# Altium schematic symbol library Semi-ATE.SchLib: 322 symbols (part 4 of 6) (continued)
## R_42 (continued)
RES SMD 1K OHM 0.1% 1W 0805; 04. Manufacturer: Vishay Thin Film; 07. Manufacturer  Part Number: PCAN0805E1001BST5; 03. Unit Price: 1.34; 13. Created Date/Name: AUG2018/Hören; 3D-Export: No; Tolerance: ±0.1%; ComponentLink1URL: https://www.digikey.de/products/en/resistors/chip-resistor-surface-mount/52?k=&pkeyword=&sv=0&pv7=243&sf=1&FV=c0172%2C44006b%2C142c040d%2C1f140000%2Cmu1+kOhms%7C2085%2Cffe00034%2C80006&quantity=&ColumnSort=0&page=1&pageSize=25; ComponentLink1Description: Info; 02. Distributor Part Number: 764-1240-6-ND; 09. Operating Temperature: -55°C ~ 155°C; 11. RoHS: YES; 01. Distributor: DigiKey; ComponentLink2Description: DataSheet; ComponentLink2URL: http://www.vishay.com/docs/60125/pcan.pdf; Type: Thin Film; Power Rating: 1W
simulation model RESISTOR (Resistor)
signal-integrity model Res
footprint TO247-2
footprint R0201 Reflow (SMT Resistor 0201 Reflow Soldering)
footprint R0402 Reflow (SMT Resistor 0402 Reflow Soldering)
footprint R0603 Reflow (SMT Resistor 0603 Reflow Soldering)
footprint R0603 Wave (SMT Resistor 0603 Wave Soldering)
footprint R0805 Wave (SMT Resistor 0805 Wave Soldering)
footprint R0805 Reflow (SMT Resistor 0805 Reflow Soldering)
footprint R01005 Reflow (SMT Resistor 01005 Reflow Soldering)
footprint R1020 Reflow (SMT Resistor 0805 Reflow Soldering)
footprint R1020 Wave (SMT Resistor 0805 Wave Soldering)
footprint R1812 Reflow (SMT Resistor 1812 Reflow Soldering)
footprint R1812 Wave (SMT Resistor 1812 Wave Soldering)
footprint R1206 Reflow (SMT Resistor 1206 Reflow Soldering)
footprint R1206 Wave (SMT Resistor 1206 Wave Soldering)
footprint R1210 Reflow (SMT Resistor 1210 Reflow Soldering)
footprint R1210 Wave (SMT Resistor 1210 Wave Soldering)
footprint R2010 Reflow (SMT Resistor 2010 Reflow Soldering)
footprint R2010 Wave (SMT Resistor 2010 Wave Soldering)
footprint R2512 Reflow (SMT Resistor 2512 Reflow Soldering)
footprint R2512 Wave (SMT Resistor 2512 Wave Soldering)
footprint TO-220-2-Standing
pins: 1, 2
1 alternate drawing of the same symbol

## R_43
designator R?, comment value 10K  Tolerance: ±0.05%  TC: ±5ppm/°C  Package: 0603  (hidden comment: R)
RES 10 KOHM 0.05% 1/10W 0603; 04. Manufacturer: Vishay Dale; 07. Manufacturer  Part Number: TNPU060310K0AZEA00; 03. Unit Price: 2.40; 13. Created Date/Name: AUG2018/Hören; Power Rating: 100mW; 3D-Export: No; ComponentLink1URL: https://www.digikey.de/product-detail/en/vishay-dale/TNPU060310K0AZEA00/541-4643-6-ND/9448930; ComponentLink1Description: Info; 02. Distributor Part Number: 541-4643-6-ND; 09. Operating Temperature: -55°C ~ 125°C; 11. RoHS: YES; 01. Distributor: DigiKey; ComponentLink2Description: DataSheet; ComponentLink2URL: http://www.vishay.com/docs/28779/tnpue3.pdf; Type: Thin Film
simulation model RESISTOR (Resistor)
signal-integrity model Res
footprint TO247-2
footprint R0201 Reflow (SMT Resistor 0201 Reflow Soldering)
footprint R0402 Reflow (SMT Resistor 0402 Reflow Soldering)
footprint R0603 Reflow (SMT Resistor 0603 Reflow Soldering)
footprint R0603 Wave (SMT Resistor 0603 Wave Soldering)
footprint R0805 Wave (SMT Resistor 0805 Wave Soldering)
footprint R0805 Reflow (SMT Resistor 0805 Reflow Soldering)
footprint R01005 Reflow (SMT Resistor 01005 Reflow Soldering)
footprint R1020 Reflow (SMT Resistor 0805 Reflow Soldering)
footprint R1020 Wave (SMT Resistor 0805 Wave Soldering)
footprint R1812 Reflow (SMT Resistor 1812 Reflow Soldering)
footprint R1812 Wave (SMT Resistor 1812 Wave Soldering)
footprint R1206 Reflow (SMT Resistor 1206 Reflow Soldering)
footprint R1206 Wave (SMT Resistor 1206 Wave Soldering)
footprint R1210 Reflow (SMT Resistor 1210 Reflow Soldering)
footprint R1210 Wave (SMT Resistor 1210 Wave Soldering)
footprint R2010 Reflow (SMT Resistor 2010 Reflow Soldering)
footprint R2010 Wave (SMT Resistor 2010 Wave Soldering)
footprint R2512 Reflow (SMT Resistor 2512 Reflow Soldering)
footprint R2512 Wave (SMT Resistor 2512 Wave Soldering)
footprint TO-220-2-Standing
pins: 1, 2
1 alternate drawing of the same symbol

## R_44
designator R?, comment value 100K  Tolerance: ±0.05%  TC: ±5ppm/°C  Package: 0603  (hidden comment: R)
RES SMD 100KOHM 0.05% 1/10W 0603; 04. Manufacturer: Vishay Dale; 07. Manufacturer  Part Number: TNPU0603100KAZEN00; 03. Unit Price: 2.83; 13. Created Date/Name: AUG2018/Hören; Power Rating: 100mW; 3D-Export: No; ComponentLink1URL: https://www.digikey.de/products/en/resistors/chip-resistor-surface-mount/52?k=&pkeyword=&sv=0&pv7=243&sf=1&FV=c017c%2C44006c%2C1f140000%2Cmu100+kOhms%7C2085%2Cffe00034%2C400005&quantity=&ColumnSort=0&page=1&pageSize=25; ComponentLink1Description: Info; 02. Distributor Part Number: TNPU100KAADKR-ND; 09. Operating Temperature: -55°C ~ 125°C; 11. RoHS: YES; 01. Distributor: DigiKey; ComponentLink2Description: DataSheet; ComponentLink2URL: http://www.vishay.com/docs/28779/tnpue3.pdf; Type: Thin Film
simulation model RESISTOR (Resistor)
signal-integrity model Res
footprint TO247-2
footprint R0201 Reflow (SMT Resistor 0201 Reflow Soldering)
footprint R0402 Reflow (SMT Resistor 0402 Reflow Soldering)
footprint R0603 Reflow (SMT Resistor 0603 Reflow Soldering)
footprint R0603 Wave (SMT Resistor 0603 Wave Soldering)
footprint R0805 Wave (SMT Resistor 0805 Wave Soldering)
footprint R0805 Reflow (SMT Resistor 0805 Reflow Soldering)
footprint R01005 Reflow (SMT Resistor 01005 Reflow Soldering)
footprint R1020 Reflow (SMT Resistor 0805 Reflow Soldering)
footprint R1020 Wave (SMT Resistor 0805 Wave Soldering)
footprint R1812 Reflow (SMT Resistor 1812 Reflow Soldering)
footprint R1812 Wave (SMT Resistor 1812 Wave Soldering)
footprint R1206 Reflow (SMT Resistor 1206 Reflow Soldering)
footprint R1206 Wave (SMT Resistor 1206 Wave Soldering)
footprint R1210 Reflow (SMT Resistor 1210 Reflow Soldering)
footprint R1210 Wave (SMT Resistor 1210 Wave Soldering)
footprint R2010 Reflow (SMT Resistor 2010 Reflow Soldering)
footprint R2010 Wave (SMT Resistor 2010 Wave Soldering)
footprint R2512 Reflow (SMT Resistor 2512 Reflow Soldering)
footprint R2512 Wave (SMT Resistor 2512 Wave Soldering)
footprint TO-220-2-Standing
pins: 1, 2
1 alternate drawing of the same symbol

## R_45
designator R?, comment value 1M  TC: ±50ppm/°C  (hidden comment: R)
RES SMD 1M OHM 0.1% 1/16W 0402; 04. Manufacturer: Yageo; 07. Manufacturer  Part Number: RE0402BRE071ML; 03. Unit Price: 2.3; 13. Created Date/Name: AUG2018/Hören; Power Rating: 63mW; 3D-Export: No; Tolerance: ±0.1%; ComponentLink1URL: https://www.digikey.de/products/en/resistors/chip-resistor-surface-mount/52?k=&pkeyword=&sv=0&pv16=4&sf=1&FV=1f140000%2Cmu1+MOhms%7C2085%2Cffe00034%2Cc0172&quantity=&ColumnSort=0&page=1&pageSize=25; ComponentLink1Description: Info; 02. Distributor Part Number: RE0402BRE071ML-ND; 09. Operating Temperature: -55°C ~ 155°C; 11. RoHS: YES; 01. Distributor: DigiKey; ComponentLink2Description: DataSheet; ComponentLink2URL: http://www.yageo.com/NewPortal/yageodocoutput?fileName=/pdf/R-Chip/PYu-RE_105_RoHS_L_6.pdf; Type: Thin Film; Package: 0402
simulation model RESISTOR (Resistor)
signal-integrity model Res
footprint TO247-2
footprint R0201 Reflow (SMT Resistor 0201 Reflow Soldering)
footprint R0402 Reflow (SMT Resistor 0402 Reflow Soldering)
footprint R0603 Reflow (SMT Resistor 0603 Reflow Soldering)
footprint R0603 Wave (SMT Resistor 0603 Wave Soldering)
footprint R0805 Wave (SMT Resistor 0805 Wave Soldering)
footprint R0805 Reflow (SMT Resistor 0805 Reflow Soldering)
footprint R01005 Reflow (SMT Resistor 01005 Reflow Soldering)
footprint R1020 Reflow (SMT Resistor 0805 Reflow Soldering)
footprint R1020 Wave (SMT Resistor 0805 Wave Soldering)
footprint R1812 Reflow (SMT Resistor 1812 Reflow Soldering)
footprint R1812 Wave (SMT Resistor 1812 Wave Soldering)
footprint R1206 Reflow (SMT Resistor 1206 Reflow Soldering)
footprint R1206 Wave (SMT Resistor 1206 Wave Soldering)
footprint R1210 Reflow (SMT Resistor 1210 Reflow Soldering)
footprint R1210 Wave (SMT Resistor 1210 Wave Soldering)
footprint R2010 Reflow (SMT Resistor 2010 Reflow Soldering)
footprint R2010 Wave (SMT Resistor 2010 Wave Soldering)
footprint R2512 Reflow (SMT Resistor 2512 Reflow Soldering)
footprint R2512 Wave (SMT Resistor 2512 Wave Soldering)
footprint TO-220-2-Standing
pins: 1, 2
1 alternate drawing of the same symbol

## R_46
designator R?, comment value 10M  Tolerance: ±1%  TC: ±100ppm/°C  (hidden comment: R)
RES SMD 10M OHM 1% 1/16W 0402; 04. Manufacturer: Yageo; 07. Manufacturer  Part Number: RC0402FR-0710ML; 03. Unit Price: 0.09; 13. Created Date/Name: AUG2018/Hören; Power Rating: 63mW; 3D-Export: No; ComponentLink1URL: https://www.digikey.de/product-detail/en/yageo/RC0402FR-0710ML/311-10.0MLRDKR-ND/2828208; ComponentLink1Description: Info; 02. Distributor Part Number: 311-10.0MLRDKR-ND; 09. Operating Temperature: -55°C ~ 155°C; 11. RoHS: YES; 01. Distributor: DigiKey; ComponentLink2Description: DataSheet; ComponentLink2URL: http://www.yageo.com/documents/recent/PYu-RC_Group_51_RoHS_L_10.pdf; Type: Thin Film; Package: 0402
simulation model RESISTOR (Resistor)
signal-integrity model Res
footprint TO247-2
footprint R0201 Reflow (SMT Resistor 0201 Reflow Soldering)
footprint R0402 Reflow (SMT Resistor 0402 Reflow Soldering)
footprint R0603 Reflow (SMT Resistor 0603 Reflow Soldering)
footprint R0603 Wave (SMT Resistor 0603 Wave Soldering)
footprint R0805 Wave (SMT Resistor 0805 Wave Soldering)
footprint R0805 Reflow (SMT Resistor 0805 Reflow Soldering)
footprint R01005 Reflow (SMT Resistor 01005 Reflow Soldering)
footprint R1020 Reflow (SMT Resistor 0805 Reflow Soldering)
footprint R1020 Wave (SMT Resistor 0805 Wave Soldering)
footprint R1812 Reflow (SMT Resistor 1812 Reflow Soldering)
footprint R1812 Wave (SMT Resistor 1812 Wave Soldering)
footprint R1206 Reflow (SMT Resistor 1206 Reflow Soldering)
footprint R1206 Wave (SMT Resistor 1206 Wave Soldering)
footprint R1210 Reflow (SMT Resistor 1210 Reflow Soldering)
footprint R1210 Wave (SMT Resistor 1210 Wave Soldering)
footprint R2010 Reflow (SMT Resistor 2010 Reflow Soldering)
footprint R2010 Wave (SMT Resistor 2010 Wave Soldering)
footprint R2512 Reflow (SMT Resistor 2512 Reflow Soldering)
footprint R2512 Wave (SMT Resistor 2512 Wave Soldering)
footprint TO-220-2-Standing
pins: 1, 2
1 alternate drawing of the same symbol

## R_47
designator R?, comment value 1K  Tolerance: ±1%  Package: 0603  (hidden comment: R)
RES SMD 1K OHM 1% 1/10W 0603; 04. Manufacturer: Panasonic Electronic Components; 07. Manufacturer  Part Number: ERJ-3EKF1001V; 03. Unit Price: 0.09; 13. Created Date/Name: AUG2018/Hören; Power Rating: 100mW; 3D-Export: No; ComponentLink1URL: https://www.digikey.de/products/en?keywords=P1.00KHCT-ND; ComponentLink1Description: Info; 02. Distributor Part Number: P1.00KHCT-ND; 09. Operating Temperature: -55°C ~ 155°C; 11. RoHS: YES; 01. Distributor: DigiKey; ComponentLink2Description: DataSheet; ComponentLink2URL: https://industrial.panasonic.com/cdbs/www-data/pdf/RDA0000/AOA0000C304.pdf; Type: Thick Film
simulation model RESISTOR (Resistor)
signal-integrity model Res
footprint TO247-2
footprint R0201 Reflow (SMT Resistor 0201 Reflow Soldering)
footprint R0402 Reflow (SMT Resistor 0402 Reflow Soldering)
footprint R0603 Reflow (SMT Resistor 0603 Reflow Soldering)
footprint R0603 Wave (SMT Resistor 0603 Wave Soldering)
footprint R0805 Wave (SMT Resistor 0805 Wave Soldering)
footprint R0805 Reflow (SMT Resistor 0805 Reflow Soldering)
footprint R01005 Reflow (SMT Resistor 01005 Reflow Soldering)
footprint R1020 Reflow (SMT Resistor 0805 Reflow Soldering)
footprint R1020 Wave (SMT Resistor 0805 Wave Soldering)
footprint R1812 Reflow (SMT Resistor 1812 Reflow Soldering)
footprint R1812 Wave (SMT Resistor 1812 Wave Soldering)
footprint R1206 Reflow (SMT Resistor 1206 Reflow Soldering)
footprint R1206 Wave (SMT Resistor 1206 Wave Soldering)
footprint R1210 Reflow (SMT Resistor 1210 Reflow Soldering)
footprint R1210 Wave (SMT Resistor 1210 Wave Soldering)
footprint R2010 Reflow (SMT Resistor 2010 Reflow Soldering)
footprint R2010 Wave (SMT Resistor 2010 Wave Soldering)
footprint R2512 Reflow (SMT Resistor 2512 Reflow Soldering)
footprint R2512 Wave (SMT Resistor 2512 Wave Soldering)
footprint TO-220-2-Standing
pins: 1, 2
1 alternate drawing of the same symbol

## R_48
designator R?, comment value 2K21  (hidden comment: R)
RES SMD 2.21KOHM 0.1% 1/16W 0402; 04. Manufacturer: Yageo; 07. Manufacturer  Part Number: RT0402BRE072K21L; 03. Unit Price: 0.36; 13. Created Date/Name: AUG2018/Hören; Power Rating: 63mW; 3D-Export: No; Tolerance: ±0.1%; ComponentLink1URL: https://www.digikey.de/products/en?keywords=YAG4367DKR-ND; ComponentLink1Description: Info; 02. Distributor Part Number: YAG4367DKR-ND; 09. Operating Temperature: -55°C ~ 155°C; 11. RoHS: YES; 01. Distributor: DigiKey; ComponentLink2Description: DataSheet; ComponentLink2URL: http://www.yageo.com/documents/recent/PYu-RT_1-to-0.01_RoHS_L_9.pdf; Type: Thin Film; Package: 0402
simulation model RESISTOR (Resistor)
signal-integrity model Res
footprint TO247-2
footprint R0201 Reflow (SMT Resistor 0201 Reflow Soldering)
footprint R0402 Reflow (SMT Resistor 0402 Reflow Soldering)
footprint R0603 Reflow (SMT Resistor 0603 Reflow Soldering)
footprint R0603 Wave (SMT Resistor 0603 Wave Soldering)
footprint R0805 Wave (SMT Resistor 0805 Wave Soldering)
footprint R0805 Reflow (SMT Resistor 0805 Reflow Soldering)
footprint R01005 Reflow (SMT Resistor 01005 Reflow Soldering)
footprint R1020 Reflow (SMT Resistor 0805 Reflow Soldering)
footprint R1020 Wave (SMT Resistor 0805 Wave Soldering)
footprint R1812 Reflow (SMT Resistor 1812 Reflow Soldering)
footprint R1812 Wave (SMT Resistor 1812 Wave Soldering)
footprint R1206 Reflow (SMT Resistor 1206 Reflow Soldering)
footprint R1206 Wave (SMT Resistor 1206 Wave Soldering)
footprint R1210 Reflow (SMT Resistor 1210 Reflow Soldering)
footprint R1210 Wave (SMT Resistor 1210 Wave Soldering)
footprint R2010 Reflow (SMT Resistor 2010 Reflow Soldering)
footprint R2010 Wave (SMT Resistor 2010 Wave Soldering)
footprint R2512 Reflow (SMT Resistor 2512 Reflow Soldering)
footprint R2512 Wave (SMT Resistor 2512 Wave Soldering)
pins: 1, 2
1 alternate drawing of the same symbol

## R_49
designator R?, comment value 22K1  (hidden comment: R)
RES SMD 22.1KOHM 0.1% 1/16W 0402; 04. Manufacturer: Yageo; 07. Manufacturer  Part Number: RT0402BRE0722K1L; 03. Unit Price: 0.36; 13. Created Date/Name: AUG2018/Hören; Power Rating: 63mW; 3D-Export: No; Tolerance: ±0.1%; ComponentLink1URL: http://www.yageo.com/documents/recent/PYu-RT_1-to-0.01_RoHS_L_9.pdf; ComponentLink1Description: Info; 02. Distributor Part Number: YAG4355DKR-ND; 09. Operating Temperature: -55°C ~ 155°C; 11. RoHS: YES; 01. Distributor: DigiKey; ComponentLink2Description: DataSheet; ComponentLink2URL: https://www.digikey.de/product-detail/en/yageo/RT0402BRE0722K1L/YAG4355DKR-ND/6617507; Type: Thin Film; Package: 0402
simulation model RESISTOR (Resistor)
signal-integrity model Res
footprint TO247-2
footprint R0201 Reflow (SMT Resistor 0201 Reflow Soldering)
footprint R0402 Reflow (SMT Resistor 0402 Reflow Soldering)
footprint R0603 Reflow (SMT Resistor 0603 Reflow Soldering)
footprint R0603 Wave (SMT Resistor 0603 Wave Soldering)
footprint R0805 Wave (SMT Resistor 0805 Wave Soldering)
footprint R0805 Reflow (SMT Resistor 0805 Reflow Soldering)
footprint R01005 Reflow (SMT Resistor 01005 Reflow Soldering)
footprint R1020 Reflow (SMT Resistor 0805 Reflow Soldering)
footprint R1020 Wave (SMT Resistor 0805 Wave Soldering)
footprint R1812 Reflow (SMT Resistor 1812 Reflow Soldering)
footprint R1812 Wave (SMT Resistor 1812 Wave Soldering)
footprint R1206 Reflow (SMT Resistor 1206 Reflow Soldering)
footprint R1206 Wave (SMT Resistor 1206 Wave Soldering)
footprint R1210 Reflow (SMT Resistor 1210 Reflow Soldering)
footprint R1210 Wave (SMT Resistor 1210 Wave Soldering)
footprint R2010 Reflow (SMT Resistor 2010 Reflow Soldering)
footprint R2010 Wave (SMT Resistor 2010 Wave Soldering)
footprint R2512 Reflow (SMT Resistor 2512 Reflow Soldering)
footprint R2512 Wave (SMT Resistor 2512 Wave Soldering)
pins: 1, 2
1 alternate drawing of the same symbol

## R_50
designator R?, comment value 2K43  (hidden comment: R)
RES SMD 2.43KOHM 0.1% 1/16W 0402; 04. Manufacturer: Yageo; 07. Manufacturer  Part Number: RT0402BRD072K43L; 03. Unit Price: 0.36; 13. Created Date/Name: AUG2018/Hören; Power Rating: 63mW; 3D-Export: No; Tolerance: ±0.1%; ComponentLink1URL: https://www.digikey.de/product-detail/en/yageo/RT0402BRD072K43L/YAG4230DKR-ND/6617382; ComponentLink1Description: Info; 02. Distributor Part Number: YAG4230DKR-ND; 09. Operating Temperature: -55°C ~ 155°C; 11. RoHS: YES; 01. Distributor: DigiKey; ComponentLink2Description: DataSheet; ComponentLink2URL: http://www.yageo.com/documents/recent/PYu-RT_1-to-0.01_RoHS_L_9.pdf; Type: Thin Film; Package: 0402
simulation model RESISTOR (Resistor)
signal-integrity model Res
footprint TO247-2
footprint R0201 Reflow (SMT Resistor 0201 Reflow Soldering)
footprint R0402 Reflow (SMT Resistor 0402 Reflow Soldering)
footprint R0603 Reflow (SMT Resistor 0603 Reflow Soldering)
footprint R0603 Wave (SMT Resistor 0603 Wave Soldering)
footprint R0805 Wave (SMT Resistor 0805 Wave Soldering)
footprint R0805 Reflow (SMT Resistor 0805 Reflow Soldering)
footprint R01005 Reflow (SMT Resistor 01005 Reflow Soldering)
footprint R1020 Reflow (SMT Resistor 0805 Reflow Soldering)
footprint R1020 Wave (SMT Resistor 0805 Wave Soldering)
footprint R1812 Reflow (SMT Resistor 1812 Reflow Soldering)
footprint R1812 Wave (SMT Resistor 1812 Wave Soldering)
footprint R1206 Reflow (SMT Resistor 1206 Reflow Soldering)
footprint R1206 Wave (SMT Resistor 1206 Wave Soldering)
footprint R1210 Reflow (SMT Resistor 1210 Reflow Soldering)
footprint R1210 Wave (SMT Resistor 1210 Wave Soldering)
footprint R2010 Reflow (SMT Resistor 2010 Reflow Soldering)
footprint R2010 Wave (SMT Resistor 2010 Wave Soldering)
footprint R2512 Reflow (SMT Resistor 2512 Reflow Soldering)
footprint R2512 Wave (SMT Resistor 2512 Wave Soldering)
pins: 1, 2
1 alternate drawing of the same symbol

## R_51
designator R?, comment value 25  (hidden comment: R)
RES 25 OHM 0.1% 1/20W 0402; 04. Manufacturer: Vishay Thin Film; 07. Manufacturer  Part Number: FC0402E25R0BTT0; 03. Unit Price: 2.24; 13. Created Date/Name: AUG2018/Hören; Power Rating: 63mW; 3D-Export: No; Tolerance: ±0.1%; ComponentLink1URL: https://www.digikey.de/product-detail/en/vishay-thin-film/FC0402E25R0BTT0/764-1328-6-ND/7103384; ComponentLink1Description: Info; 02. Distributor Part Number: 764-1328-6-ND; 09. Operating Temperature: -55°C ~ 155°C; 11. RoHS: YES; 01. Distributor: DigiKey; ComponentLink2Description: DataSheet; ComponentLink2URL: http://www.vishay.com/docs/60093/fcseries.pdf; Type: Thin Film; Package: 0402
simulation model RESISTOR (Resistor)
signal-integrity model Res
footprint TO247-2
footprint R0201 Reflow (SMT Resistor 0201 Reflow Soldering)
footprint R0402 Reflow (SMT Resistor 0402 Reflow Soldering)
footprint R0603 Reflow (SMT Resistor 0603 Reflow Soldering)
footprint R0603 Wave (SMT Resistor 0603 Wave Soldering)
footprint R0805 Wave (SMT Resistor 0805 Wave Soldering)
footprint R0805 Reflow (SMT Resistor 0805 Reflow Soldering)
footprint R01005 Reflow (SMT Resistor 01005 Reflow Soldering)
footprint R1020 Reflow (SMT Resistor 0805 Reflow Soldering)
footprint R1020 Wave (SMT Resistor 0805 Wave Soldering)
footprint R1812 Reflow (SMT Resistor 1812 Reflow Soldering)
footprint R1812 Wave (SMT Resistor 1812 Wave Soldering)
footprint R1206 Reflow (SMT Resistor 1206 Reflow Soldering)
footprint R1206 Wave (SMT Resistor 1206 Wave Soldering)
footprint R1210 Reflow (SMT Resistor 1210 Reflow Soldering)
footprint R1210 Wave (SMT Resistor 1210 Wave Soldering)
footprint R2010 Reflow (SMT Resistor 2010 Reflow Soldering)
footprint R2010 Wave (SMT Resistor 2010 Wave Soldering)
footprint R2512 Reflow (SMT Resistor 2512 Reflow Soldering)
footprint R2512 Wave (SMT Resistor 2512 Wave Soldering)
pins: 1, 2
1 alternate drawing of the same symbol

## R_52
designator R?, comment value 3K4  (hidden comment: R)
RES SMD 3.4K OHM 1% 1/16W 0402; 04. Manufacturer: Yageo; 07. Manufacturer  Part Number: RC0402FR-073K4L; 03. Unit Price: 0.09; 13. Created Date/Name: AUG2018/Hören; Power Rating: 63mw; 3D-Export: No; Tolerance: ±1%; ComponentLink1URL: https://www.digikey.de/product-detail/en/yageo/RC0402FR-073K4L/YAG3149DKR-ND/5283020; ComponentLink1Description: Info; 02. Distributor Part Number: YAG3149DKR-ND; 09. Operating Temperature: -55°C ~ 155°C; 11. RoHS: YES; 01. Distributor: DigiKey; ComponentLink2Description: DataSheet; ComponentLink2URL: http://www.yageo.com/documents/recent/PYu-RC_Group_51_RoHS_L_10.pdf; Type: Thick Film; Package: 0402
simulation model RESISTOR (Resistor)
signal-integrity model Res
footprint TO247-2
footprint R0201 Reflow (SMT Resistor 0201 Reflow Soldering)
footprint R0402 Reflow (SMT Resistor 0402 Reflow Soldering)
footprint R0603 Reflow (SMT Resistor 0603 Reflow Soldering)
footprint R0603 Wave (SMT Resistor 0603 Wave Soldering)
footprint R0805 Wave (SMT Resistor 0805 Wave Soldering)
footprint R0805 Reflow (SMT Resistor 0805 Reflow Soldering)
footprint R01005 Reflow (SMT Resistor 01005 Reflow Soldering)
footprint R1020 Reflow (SMT Resistor 0805 Reflow Soldering)
footprint R1020 Wave (SMT Resistor 0805 Wave Soldering)
footprint R1812 Reflow (SMT Resistor 1812 Reflow Soldering)
footprint R1812 Wave (SMT Resistor 1812 Wave Soldering)
footprint R1206 Reflow (SMT Resistor 1206 Reflow Soldering)
footprint R1206 Wave (SMT Resistor 1206 Wave Soldering)
footprint R1210 Reflow (SMT Resistor 1210 Reflow Soldering)
footprint R1210 Wave (SMT Resistor 1210 Wave Soldering)
footprint R2010 Reflow (SMT Resistor 2010 Reflow Soldering)
footprint R2010 Wave (SMT Resistor 2010 Wave Soldering)
footprint R2512 Reflow (SMT Resistor 2512 Reflow Soldering)
footprint R2512 Wave (SMT Resistor 2512 Wave Soldering)
footprint TO-220-2-Standing
pins: 1, 2
1 alternate drawing of the same symbol

## R_53
designator R?, comment value 66K5  (hidden comment: R)
RES SMD 66.5K OHM 1% 1/16W 0402; 04. Manufacturer: Yageo; 07. Manufacturer  Part Number: RC0402FR-0766K5L; 03. Unit Price: 0.09; 13. Created Date/Name: AUG2018/Hören; Power Rating: 63mw; 3D-Export: No; Tolerance: ±1%; ComponentLink1URL: https://www.digikey.de/product-detail/en/yageo/RC0402FR-0766K5L/YAG3209DKR-ND/5283080; ComponentLink1Description: Info; 02. Distributor Part Number: YAG3209DKR-ND; 09. Operating Temperature: -55°C ~ 155°C; 11. RoHS: YES; 01. Distributor: DigiKey; ComponentLink2Description: DataSheet; ComponentLink2URL: http://www.yageo.com/documents/recent/PYu-RC_Group_51_RoHS_L_10.pdf; Type: Thick Film; Package: 0402
simulation model RESISTOR (Resistor)
signal-integrity model Res
footprint TO247-2
footprint R0201 Reflow (SMT Resistor 0201 Reflow Soldering)
footprint R0402 Reflow (SMT Resistor 0402 Reflow Soldering)
footprint R0603 Reflow (SMT Resistor 0603 Reflow Soldering)
footprint R0603 Wave (SMT Resistor 0603 Wave Soldering)
footprint R0805 Wave (SMT Resistor 0805 Wave Soldering)
footprint R0805 Reflow (SMT Resistor 0805 Reflow Soldering)
footprint R01005 Reflow (SMT Resistor 01005 Reflow Soldering)
footprint R1020 Reflow (SMT Resistor 0805 Reflow Soldering)
footprint R1020 Wave (SMT Resistor 0805 Wave Soldering)
footprint R1812 Reflow (SMT Resistor 1812 Reflow Soldering)
footprint R1812 Wave (SMT Resistor 1812 Wave Soldering)
footprint R1206 Reflow (SMT Resistor 1206 Reflow Soldering)
footprint R1206 Wave (SMT Resistor 1206 Wave Soldering)
footprint R1210 Reflow (SMT Resistor 1210 Reflow Soldering)
footprint R1210 Wave (SMT Resistor 1210 Wave Soldering)
footprint R2010 Reflow (SMT Resistor 2010 Reflow Soldering)
footprint R2010 Wave (SMT Resistor 2010 Wave Soldering)
footprint R2512 Reflow (SMT Resistor 2512 Reflow Soldering)
footprint R2512 Wave (SMT Resistor 2512 Wave Soldering)
footprint TO-220-2-Standing
pins: 1, 2
1 alternate drawing of the same symbol

## R_54
designator R?, comment value 1K  (hidden comment: R)
RES SMD 1K OHM 1% 1/16W 0402; 04. Manufacturer: Yageo; 07. Manufacturer  Part Number: RC0402FR-071KL; 03. Unit Price: 0.09; 13. Created Date/Name: AUG2018/Hören; 3D-Export: No; Tolerance: ±1%; ComponentLink1URL: https://www.digikey.de/product-detail/en/yageo/RC0402FR-071KL/311-1.00KLRDKR-ND/732407; ComponentLink1Description: Info; 02. Distributor Part Number: 311-1.00KLRDKR-ND; 09. Operating Temperature: -55°C ~ 155°C; 11. RoHS: YES; 01. Distributor: DigiKey; ComponentLink2Description: DataSheet; ComponentLink2URL: http://www.yageo.com/documents/recent/PYu-RC_Group_51_RoHS_L_10.pdf
simulation model RESISTOR (Resistor)
signal-integrity model Res
footprint TO247-2
footprint R0201 Reflow (SMT Resistor 0201 Reflow Soldering)
footprint R0402 Reflow (SMT Resistor 0402 Reflow Soldering)
footprint R0603 Reflow (SMT Resistor 0603 Reflow Soldering)
footprint R0603 Wave (SMT Resistor 0603 Wave Soldering)
footprint R0805 Wave (SMT Resistor 0805 Wave Soldering)
footprint R0805 Reflow (SMT Resistor 0805 Reflow Soldering)
footprint R01005 Reflow (SMT Resistor 01005 Reflow Soldering)
footprint R1020 Reflow (SMT Resistor 0805 Reflow Soldering)
footprint R1020 Wave (SMT Resistor 0805 Wave Soldering)
footprint R1812 Reflow (SMT Resistor 1812 Reflow Soldering)
footprint R1812 Wave (SMT Resistor 1812 Wave Soldering)
footprint R1206 Reflow (SMT Resistor 1206 Reflow Soldering)
footprint R1206 Wave (SMT Resistor 1206 Wave Soldering)
footprint R1210 Reflow (SMT Resistor 1210 Reflow Soldering)
footprint R1210 Wave (SMT Resistor 1210 Wave Soldering)
footprint R2010 Reflow (SMT Resistor 2010 Reflow Soldering)
footprint R2010 Wave (SMT Resistor 2010 Wave Soldering)
footprint R2512 Reflow (SMT Resistor 2512 Reflow Soldering)
footprint R2512 Wave (SMT Resistor 2512 Wave Soldering)
pins: 1, 2
1 alternate drawing of the same symbol

## R_55
designator R?, comment value 48.7  Package: 0805  (hidden comment: R)
RES SMD 48.7 OHM 0.1% 1/8W 0805; 04. Manufacturer: Panasonic Electronic Components; 07. Manufacturer  Part Number: ERA-6AEB48R7V; 03. Unit Price: 0.32; 13. Created Date/Name: AUG2018/Hören; Power Rating: 125mW; 3D-Export: No; Tolerance: ±0.1%; ComponentLink1URL: https://www.digikey.de/products/en?keywords=P48.7DACT-ND; ComponentLink1Description: Info; 02. Distributor Part Number: P48.7DACT-ND; 09. Operating Temperature: -55°C ~ 155°C; 11. RoHS: YES; 01. Distributor: DigiKey; ComponentLink2Description: DataSheet; ComponentLink2URL: https://industrial.panasonic.com/cdbs/www-data/pdf/RDM0000/AOA0000C307.pdf; Type: Thin Film
simulation model RESISTOR (Resistor)
signal-integrity model Res
footprint TO247-2
footprint R0201 Reflow (SMT Resistor 0201 Reflow Soldering)
footprint R0402 Reflow (SMT Resistor 0402 Reflow Soldering)
footprint R0603 Reflow (SMT Resistor 0603 Reflow Soldering)
footprint R0603 Wave (SMT Resistor 0603 Wave Soldering)
footprint R0805 Wave (SMT Resistor 0805 Wave Soldering)
footprint R0805 Reflow (SMT Resistor 0805 Reflow Soldering)
footprint R01005 Reflow (SMT Resistor 01005 Reflow Soldering)
footprint R1020 Reflow (SMT Resistor 0805 Reflow Soldering)
footprint R1020 Wave (SMT Resistor 0805 Wave Soldering)
footprint R1812 Reflow (SMT Resistor 1812 Reflow Soldering)
footprint R1812 Wave (SMT Resistor 1812 Wave Soldering)
footprint R1206 Reflow (SMT Resistor 1206 Reflow Soldering)
footprint R1206 Wave (SMT Resistor 1206 Wave Soldering)
footprint R1210 Reflow (SMT Resistor 1210 Reflow Soldering)
footprint R1210 Wave (SMT Resistor 1210 Wave Soldering)
footprint R2010 Reflow (SMT Resistor 2010 Reflow Soldering)
footprint R2010 Wave (SMT Resistor 2010 Wave Soldering)
footprint R2512 Reflow (SMT Resistor 2512 Reflow Soldering)
footprint R2512 Wave (SMT Resistor 2512 Wave Soldering)
pins: 1, 2
1 alternate drawing of the same symbol

## RES1A
designator R?, comment value 4K7  (hidden comment: R)
RES SMD 4.7K OHM 1% 1/16W 0402; 04. Manufacturer: Yageo; 07. Manufacturer  Part Number: RC0402FR-074K7L; POPULATED: yes; Parameters: 1/16W, 50V, 1%; 03. Unit Price: 0.09; Voltage Rating: 50V; 3D-Export: No; 01. Distributor: DigiKey; 02. Distributor Part Number: 311-4.7KLRDKR-ND; 09. Operating Temperature: -55°C ~ 155°C; 11. RoHS: YES; Temperature Range: -55°C/+125°C; Power Rating: 1/16W; Tolerance: ±1%; Type: Thick Film; ComponentLink4Description: Info; ComponentLink4URL: https://www.digikey.de/product-detail/en/yageo/RC0402FR-074K7L/311-4.7KLRDKR-ND/2828199; ComponentLink5Description: DataSheet; ComponentLink5URL: http://www.yageo.com/documents/recent/PYu-RC_Group_51_RoHS_L_10.pdf
footprint R0402 (Chip Resistor, Body 1.1x0.5mm (LxW typ), IPC High Density)
footprint R0603 (Chip Resistor, Body 1.6x0.8mm (LxW typ), IPC High Density)
footprint R0805 (Chip Resistor, Body 2.0x1.3mm (LxW typ), IPC High Density)
footprint R1206 (Chip Resistor, Body 3.2x1.6mm (LxW typ), IPC High Density)
footprint R1210 (Chip Resistor, Body 3.2x2.5mm (LxW typ), IPC High Density)
footprint R2010 (Chip Resistor, Body 5.0x2.5mm (LxW typ), IPC High Density)
footprint R2512 (Chip Resistor, Body 6.3x3.2mm (LxW typ), IPC High Density)
footprint R0402 Reflow
pins: 1, 2

## RES1A_1
designator R?, comment value 1K  (hidden comment: R)
RES SMD 1K OHM 1% 1/16W 0402; 04. Manufacturer: Yageo; 07. Manufacturer  Part Number: RC0402FR-071KL; Parameters: 1/16W, 50V, 1%; POPULATED: yes; 03. Unit Price: 0.09; Voltage Rating: 50V; 3D-Export: No; 01. Distributor: DigiKey; 02. Distributor Part Number: 311-1.00KLRDKR-ND; 09. Operating Temperature: -55°C ~ 155°C; 11. RoHS: YES; Temperature Range: -55°C/+125°C; Power Rating: 1/16W; Tolerance: ±1%; Type: Thick Film; ComponentLink4Description: Info; ComponentLink4URL: https://www.digikey.de/products/en?keywords=311-1.00KLRDKR-ND; ComponentLink5Description: DataSheet; ComponentLink5URL: http://www.yageo.com/documents/recent/PYu-RC_Group_51_RoHS_L_10.pdf
footprint R0603 (Chip Resistor, Body 1.6x0.8mm (LxW typ), IPC High Density)
footprint R0402
footprint R0402 Reflow
pins: 1, 2

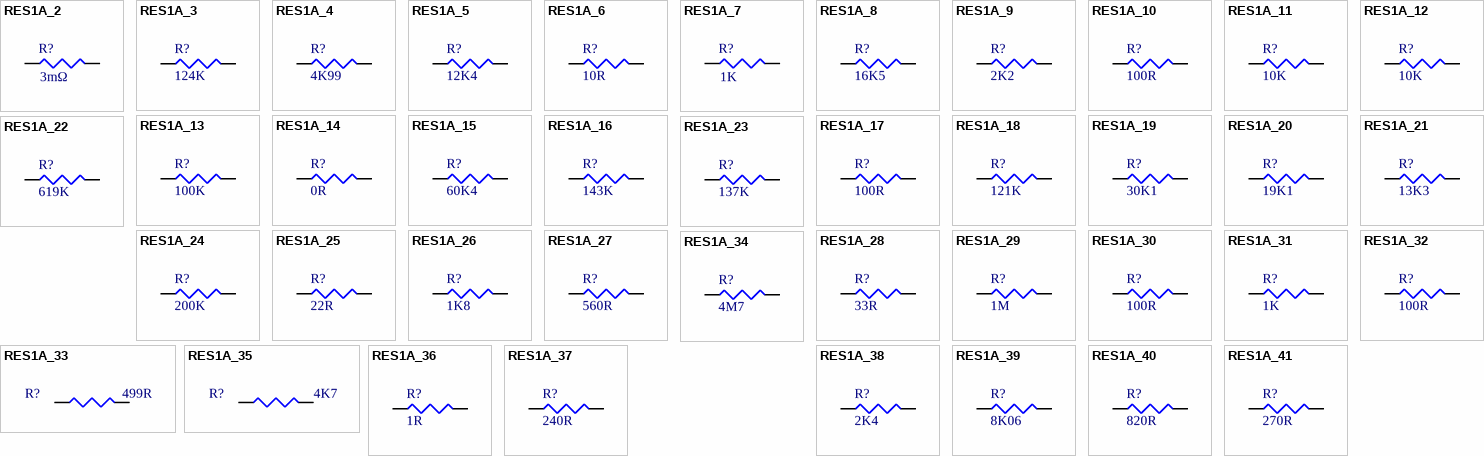
[diagram p12: symbols RES1A_2 to RES1A_41]

## RES1A_2
designator R?, comment value 3mΩ  (hidden comment: R)
RES 0.003 OHM 1% 1W 1206; 04. Manufacturer: Stackpole Electronics Inc; 07. Manufacturer  Part Number: CSNL1206FT3L00; POPULATED: yes; Parameters: 1%, 1W; 03. Unit Price: 0.6; 3D-Export: No; 01. Distributor: DigiKey; 02. Distributor Part Number: CSNL1206FT3L00DKR-ND; 09. Operating Temperature: -55°C ~ 170°C; 11. RoHS: YES; Temperature Range: -55°C ~ 170°C; Power Rating: 1W; Tolerance: ±1%; Type: Metal Element; ComponentLink4Description: Info; ComponentLink4URL: https://www.digikey.de/product-detail/en/stackpole-electronics-inc/CSNL1206FT3L00/CSNL1206FT3L00DKR-ND/1788170
footprint R0402 (Chip Resistor, Body 1.1x0.5mm (LxW typ), IPC High Density)
footprint R0603 (Chip Resistor, Body 1.6x0.8mm (LxW typ), IPC High Density)
footprint R0805 (Chip Resistor, Body 2.0x1.3mm (LxW typ), IPC High Density)
footprint R1206 (Chip Resistor, Body 3.2x1.6mm (LxW typ), IPC High Density)
footprint R1210 (Chip Resistor, Body 3.2x2.5mm (LxW typ), IPC High Density)
footprint R2010 (Chip Resistor, Body 5.0x2.5mm (LxW typ), IPC High Density)
footprint R2512 (Chip Resistor, Body 6.3x3.2mm (LxW typ), IPC High Density)
footprint R1206 Reflow
pins: 1, 2

## RES1A_3
designator R?, comment value 124K  (hidden comment: R)
RES SMD 124K OHM 1% 1/16W 0402; 04. Manufacturer: Yageo; 07. Manufacturer  Part Number: RC0402FR-07124KL; POPULATED: yes; Parameters: 1/16W, 50V, 1%; 03. Unit Price: 0.09; Voltage Rating: 50V; 3D-Export: No; 01. Distributor: DigiKey; 02. Distributor Part Number: 311-124KLRDKR-ND; 09. Operating Temperature: -55°C ~ 155°C; 11. RoHS: YES; Temperature Range: -55°C/+125°C; Power Rating: 1/16W; Tolerance: ±1%; Type: Thick Film; ComponentLink4Description: Info; ComponentLink4URL: https://www.digikey.de/product-detail/en/yageo/RC0402FR-071KL/311-1.00KLRDKR-ND/732407; ComponentLink5Description: DataSheet; ComponentLink5URL: http://www.yageo.com/documents/recent/PYu-RC_Group_51_RoHS_L_10.pdf
footprint R0402 (Chip Resistor, Body 1.1x0.5mm (LxW typ), IPC High Density)
footprint R0603 (Chip Resistor, Body 1.6x0.8mm (LxW typ), IPC High Density)
footprint R0805 (Chip Resistor, Body 2.0x1.3mm (LxW typ), IPC High Density)
footprint R1206 (Chip Resistor, Body 3.2x1.6mm (LxW typ), IPC High Density)
footprint R1210 (Chip Resistor, Body 3.2x2.5mm (LxW typ), IPC High Density)
footprint R2010 (Chip Resistor, Body 5.0x2.5mm (LxW typ), IPC High Density)
footprint R2512 (Chip Resistor, Body 6.3x3.2mm (LxW typ), IPC High Density)
footprint R0402 Reflow
pins: 1, 2

## RES1A_4
designator R?, comment value 4K99  (hidden comment: R)
RES SMD 4.99K OHM 1% 1/16W 0402; 04. Manufacturer: Yageo; 07. Manufacturer  Part Number: RC0402FR-074K99L; POPULATED: yes; Parameters: 1/16W, 50V, 1%; 03. Unit Price: 0.09; Voltage Rating: 50V; 3D-Export: No; 01. Distributor: DigiKey; 02. Distributor Part Number: 311-4.99KLRDKR-ND; 09. Operating Temperature: -55°C ~ 155°C; 11. RoHS: YES; Temperature Range: -55°C/+125°C; Power Rating: 1/16W; Tolerance: ±1%; Type: Thick Film; ComponentLink4Description: Info; ComponentLink4URL: https://www.digikey.de/product-detail/en/yageo/RC0402FR-074K99L/311-4.99KLRDKR-ND/2828204
footprint R0402 (Chip Resistor, Body 1.1x0.5mm (LxW typ), IPC High Density)
footprint R0603 (Chip Resistor, Body 1.6x0.8mm (LxW typ), IPC High Density)
footprint R0805 (Chip Resistor, Body 2.0x1.3mm (LxW typ), IPC High Density)
footprint R1206 (Chip Resistor, Body 3.2x1.6mm (LxW typ), IPC High Density)
footprint R1210 (Chip Resistor, Body 3.2x2.5mm (LxW typ), IPC High Density)
footprint R2010 (Chip Resistor, Body 5.0x2.5mm (LxW typ), IPC High Density)
footprint R2512 (Chip Resistor, Body 6.3x3.2mm (LxW typ), IPC High Density)
footprint R0402 Reflow
pins: 1, 2

## RES1A_5
designator R?, comment value 12K4  (hidden comment: R)
RES SMD 12.4K OHM 1% 1/16W 0402; 04. Manufacturer: Yageo; 07. Manufacturer  Part Number: RC0402FR-0712K4L; POPULATED: yes; Parameters: 1/16W, 50V, 1%; 03. Unit Price: 0.09; Voltage Rating: 50V; 3D-Export: No; 01. Distributor: DigiKey; 02. Distributor Part Number: 311-12.4KLRDKR-ND; 09. Operating Temperature: -55°C ~ 155°C; 11. RoHS: YES; Temperature Range: -55°C/+125°C; Power Rating: 1/16W; Tolerance: ±1%; Type: Thick Film; ComponentLink4Description: Info; ComponentLink4URL: https://www.digikey.de/product-detail/en/yageo/RC0402FR-0712K4L/311-12.4KLRDKR-ND/2828257
footprint R0402 (Chip Resistor, Body 1.1x0.5mm (LxW typ), IPC High Density)
footprint R0603 (Chip Resistor, Body 1.6x0.8mm (LxW typ), IPC High Density)
footprint R0805 (Chip Resistor, Body 2.0x1.3mm (LxW typ), IPC High Density)
footprint R1206 (Chip Resistor, Body 3.2x1.6mm (LxW typ), IPC High Density)
footprint R1210 (Chip Resistor, Body 3.2x2.5mm (LxW typ), IPC High Density)
footprint R2010 (Chip Resistor, Body 5.0x2.5mm (LxW typ), IPC High Density)
footprint R2512 (Chip Resistor, Body 6.3x3.2mm (LxW typ), IPC High Density)
footprint R0402 Reflow
pins: 1, 2